# Altium footprint library Generic Footprint.PcbLib: 160 footprints (part 14 of 20) (continued)
## Symbol_FCC-Logo-1.5x1mm_silkscreen [mm] (continued)
1(1.122,0.241) 1(1.122,0.838) 1(1.122,0.841) 1(1.122,1.042) 1(1.122,1.044) 1(1.122,1.045) 1(1.124,0.032) 1(1.124,0.037) 1(1.124,0.17) 1(1.124,0.372) 1(1.124,0.374) 1(1.124,0.702) 1(1.124,0.705) 1(1.124,0.836) 1(1.124,1.04) 1(1.125,0.037) 1(1.125,0.166) 1(1.125,0.168) 1(1.125,0.377) 1(1.127,0.037) 1(1.127,0.238) 1(1.127,0.24) 1(1.127,0.241) 1(1.127,0.374) 1(1.127,0.377) 1(1.127,0.7) 1(1.127,0.835) 1(1.127,0.838) 1(1.127,0.84) 1(1.127,0.909) 1(1.129,0.241) 1(1.129,0.243) 1(1.129,0.376) 1(1.129,0.379) 1(1.129,0.699) 1(1.129,0.702) 1(1.129,0.906) 1(1.129,0.909) 1(1.13,0.376) 1(1.13,0.377) 1(1.13,0.381) 1(1.13,0.702) 1(1.132,0.037) 1(1.132,0.168) 1(1.132,0.172) 1(1.132,0.24) 1(1.132,0.241) 1(1.132,0.379) 1(1.132,0.382) 1(1.132,0.7) 1(1.132,0.909) 1(1.132,1.044) 1(1.134,0.034) 1(1.134,0.036) 1(1.134,0.17) 1(1.134,0.243) 1(1.134,0.245) 1(1.134,0.379) 1(1.134,0.381) 1(1.134,0.697) 1(1.134,0.699) 1(1.134,0.7) 1(1.134,0.836) 1(1.134,0.908) 1(1.134,0.909) 1(1.134,1.039) 1(1.134,1.04) 1(1.134,1.042) 1(1.135,0.833) 1(1.135,0.835) 1(1.135,0.836) 1(1.135,0.838) 1(1.135,0.904) 1(1.137,0.381) 1(1.137,0.382) 1(1.137,0.384) 1(1.139,0.241) 1(1.139,0.245) 1(1.139,0.382) 1(1.139,0.695) 1(1.139,0.697) 1(1.139,0.699) 1(1.141,0.17) 1(1.141,0.172) 1(1.141,0.175) 1(1.141,0.386) 1(1.141,0.388) 1(1.141,0.831) 1(1.141,0.833) 1(1.141,0.908) 1(1.141,1.042) 1(1.142,0.036) 1(1.142,0.694) 1(1.142,0.695) 1(1.142,0.697) 1(1.142,0.835) 1(1.142,0.903) 1(1.142,0.904) 1(1.142,0.906) 1(1.142,1.039) 1(1.144,0.243) 1(1.144,0.389) 1(1.144,0.69) 1(1.144,0.692) 1(1.144,0.694) 1(1.144,0.695) 1(1.144,1.037) 1(1.146,0.692) 1(1.146,0.83) 1(1.146,0.831) 1(1.146,1.04) 1(1.147,0.172) 1(1.147,0.173) 1(1.147,0.175) 1(1.147,0.177) 1(1.147,0.391) 1(1.147,0.688) 1(1.147,0.692) 1(1.147,0.694) 1(1.149,0.391) 1(1.149,0.393) 1(1.149,0.687) 1(1.149,0.83) 1(1.149,0.833) 1(1.149,0.901) 1(1.149,0.903) 1(1.149,0.904) 1(1.149,0.906) 1(1.151,0.245) 1(1.153,0.037) 1(1.153,0.391) 1(1.153,1.035) 1(1.153,1.037) 1(1.154,0.175) 1(1.154,0.177) 1(1.154,0.178) 1(1.154,0.246) 1(1.154,0.393) 1(1.154,0.396) 1(1.154,0.685) 1(1.154,0.831) 1(1.154,1.035) 1(1.156,0.251) 1(1.156,0.393) 1(1.156,0.394) 1(1.156,0.396) 1(1.156,0.398) 1(1.156,0.682) 1(1.156,0.683) 1(1.156,0.899) 1(1.156,0.901) 1(1.156,0.903) 1(1.158,0.177) 1(1.158,0.248) 1(1.158,0.396) 1(1.158,0.398) 1(1.158,0.399) 1(1.158,0.683) 1(1.158,1.035) 1(1.158,1.039) 1(1.159,0.039) 1(1.159,0.042) 1(1.159,0.18) 1(1.159,0.25) 1(1.159,0.251) 1(1.159,0.253) 1(1.159,0.401) 1(1.159,0.68) 1(1.159,0.682) 1(1.159,1.035) 1(1.161,0.398) 1(1.161,0.683) 1(1.161,0.824) 1(1.161,0.828) 1(1.161,0.83) 1(1.161,0.898) 1(1.161,0.899) 1(1.161,0.901) 1(1.163,0.403) 1(1.163,0.678) 1(1.163,0.68) 1(1.163,0.682) 1(1.164,0.182) 1(1.164,0.251) 1(1.164,0.255) 1(1.164,0.405) 1(1.164,0.677) 1(1.164,0.678) 1(1.164,0.68) 1(1.164,0.823) 1(1.164,0.824) 1(1.164,0.826) 1(1.166,0.042) 1(1.166,0.253) 1(1.166,0.405) 1(1.166,0.406) 1(1.166,0.673) 1(1.166,0.675) 1(1.166,0.677) 1(1.166,0.678) 1(1.166,0.894) 1(1.166,0.896) 1(1.166,0.899) 1(1.168,0.041) 1(1.168,0.044) 1(1.168,0.046) 1(1.168,0.406) 1(1.168,0.408) 1(1.168,0.677) 1(1.168,0.821) 1(1.168,0.823) 1(1.168,1.037) 1(1.17,0.184) 1(1.17,0.253) 1(1.17,0.255) 1(1.17,0.257) 1(1.17,0.405) 1(1.17,0.41) 1(1.17,0.671) 1(1.17,0.819) 1(1.17,0.824) 1(1.171,0.182) 1(1.171,0.257) 1(1.171,0.406) 1(1.171,0.408) 1(1.171,0.41) 1(1.171,0.411) 1(1.171,0.67) 1(1.173,0.042) 1(1.173,0.182) 1(1.173,0.408) 1(1.173,0.411) 1(1.173,0.413) 1(1.173,0.668) 1(1.173,0.67) 1(1.173,0.671) 1(1.173,0.823) 1(1.173,0.892) 1(1.173,1.035) 1(1.175,0.044) 1(1.175,0.046) 1(1.175,0.047) 1(1.175,0.185) 1(1.175,0.255) 1(1.175,0.26) 1(1.175,0.41) 1(1.175,0.411) 1(1.175,0.413) 1(1.175,0.415) 1(1.175,0.666) 1(1.175,0.668) 1(1.175,0.671) 1(1.175,0.818) 1(1.175,0.819) 1(1.175,0.821) 1(1.175,1.03) 1(1.176,0.044) 1(1.176,0.046) 1(1.176,0.184) 1(1.176,0.257) 1(1.176,0.26) 1(1.176,0.416) 1(1.176,0.663) 1(1.176,0.665) 1(1.176,0.668) 1(1.176,0.67) 1(1.176,0.819) 1(1.176,0.891) 1(1.176,0.894) 1(1.176,1.034) 1(1.178,0.046) 1(1.178,0.413) 1(1.178,0.415) 1(1.178,0.416) 1(1.178,0.418) 1(1.178,0.42) 1(1.178,0.665) 1(1.178,0.666) 1(1.178,0.816) 1(1.178,0.818) 1(1.178,0.821) 1(1.178,0.894) 1(1.18,0.044) 1(1.18,0.258) 1(1.18,0.415) 1(1.18,0.416) 1(1.18,0.418) 1(1.18,0.422) 1(1.18,0.661) 1(1.18,0.663) 1(1.18,0.666) 1(1.181,0.044) 1(1.181,0.047) 1(1.181,0.184) 1(1.181,0.185) 1(1.181,0.187) 1(1.181,0.418) 1(1.181,0.42) 1(1.181,0.422) 1(1.181,0.423) 1(1.181,0.656) 1(1.181,0.658) 1(1.181,0.659) 1(1.181,0.663) 1(1.181,0.665) 1(1.181,0.814) 1(1.181,0.889) 1(1.181,0.892) 1(1.181,1.028) 1(1.181,1.03) 1(1.181,1.032) 1(1.183,0.046) 1(1.183,0.049) 1(1.183,0.26) 1(1.183,0.263) 1(1.183,0.42) 1(1.183,0.422) 1(1.183,0.423) 1(1.183,0.425) 1(1.183,0.654) 1(1.183,0.816) 1(1.185,0.185) 1(1.185,0.187) 1(1.185,0.189) 1(1.185,0.814) 1(1.185,0.818) 1(1.185,0.891) 1(1.185,0.892) 1(1.187,0.049) 1(1.187,0.051) 1(1.187,0.262) 1(1.187,0.263) 1(1.187,0.265) 1(1.187,0.653) 1(1.187,0.654) 1(1.187,1.027) 1(1.187,1.028) 1(1.187,1.03) 1(1.188,0.047) 1(1.188,0.187) 1(1.188,0.19) 1(1.188,0.267) 1(1.188,0.816) 1(1.188,0.887) 1(1.19,0.189) 1(1.19,0.19) 1(1.19,0.192) 1(1.19,0.263) 1(1.19,0.267) 1(1.19,0.646) 1(1.19,0.648) 1(1.19,0.654) 1(1.19,0.886) 1(1.19,0.889) 1(1.19,0.891) 1(1.192,0.19) 1(1.192,0.265) 1(1.192,0.269) 1(1.192,0.648) 1(1.192,0.651) 1(1.192,0.814) 1(1.192,0.887) 1(1.193,0.189) 1(1.193,0.194) 1(1.193,0.809) 1(1.193,0.884) 1(1.193,0.886) 1(1.193,0.889) 1(1.195,0.049) 1(1.195,0.051) 1(1.195,0.265) 1(1.195,0.267) 1(1.195,0.269) 1(1.195,0.27) 1(1.195,0.649) 1(1.195,0.807) 1(1.195,0.809) 1(1.195,0.811) 1(1.195,0.813) 1(1.195,0.887) 1(1.195,1.025) 1(1.195,1.027) 1(1.195,1.028) 1(1.197,0.049) 1(1.197,1.023) 1(1.198,0.049) 1(1.198,0.195) 1(1.198,0.27) 1(1.198,0.272) 1(1.198,0.806) 1(1.198,0.807) 1(1.198,0.809) 1(1.198,0.882) 1(1.198,0.884) 1(1.198,0.886) 1(1.2,0.269) 1(1.2,1.023) 1(1.2,1.025) 1(1.2,1.027) 1(1.202,0.194) 1(1.202,0.197) 1(1.202,0.272) 1(1.202,0.274) 1(1.202,0.804) 1(1.202,0.806) 1(1.202,0.807) 1(1.202,0.881) 1(1.202,0.884) 1(1.202,1.022) 1(1.204,0.194) 1(1.204,0.27) 1(1.204,0.274) 1(1.204,0.804) 1(1.204,0.806) 1(1.205,0.051) 1(1.205,0.195) 1(1.205,0.199) 1(1.205,0.801) 1(1.205,1.022) 1(1.205,1.025) 1(1.207,0.053) 1(1.207,0.272) 1(1.207,0.801) 1(1.207,0.804) 1(1.207,0.879) 1(1.209,0.195) 1(1.209,0.197) 1(1.209,0.199) 1(1.209,0.201) 1(1.209,0.274) 1(1.209,0.279) 1(1.209,0.799) 1(1.209,0.877) 1(1.209,1.02) 1(1.21,0.275) 1(1.21,0.802) 1(1.21,1.02) 1(1.21,1.023) 1(1.212,0.054) 1(1.212,0.058) 1(1.212,0.197) 1(1.212,0.201) 1(1.212,0.279) 1(1.212,0.799) 1(1.212,0.875) 1(1.214,0.199) 1(1.214,0.202) 1(1.214,0.277) 1(1.214,0.28) 1(1.214,0.797) 1(1.214,0.801) 1(1.215,0.059) 1(1.215,0.282) 1(1.215,0.796) 1(1.215,0.797) 1(1.215,0.874) 1(1.215,0.877) 1(1.217,0.056) 1(1.217,0.058) 1(1.217,0.201) 1(1.217,0.202) 1(1.217,0.204) 1(1.217,0.279) 1(1.217,0.28) 1(1.217,0.284) 1(1.217,0.796) 1(1.217,0.797) 1(1.217,0.799) 1(1.217,0.875) 1(1.217,0.877) 1(1.217,1.022) 1(1.219,0.28) 1(1.219,0.282) 1(1.219,0.286) 1(1.219,0.792) 1(1.219,0.872) 1(1.22,0.202) 1(1.22,0.204) 1(1.22,0.206) 1(1.22,0.282) 1(1.22,0.284) 1(1.22,0.286) 1(1.22,0.287) 1(1.22,0.874) 1(1.22,0.875) 1(1.22,1.015) 1(1.22,1.017) 1(1.22,1.02) 1(1.222,0.058) 1(1.222,0.059) 1(1.222,0.061) 1(1.222,0.79) 1(1.222,0.792) 1(1.222,0.794) 1(1.222,0.796) 1(1.224,0.063) 1(1.224,0.204) 1(1.224,0.206) 1(1.224,0.207) 1(1.224,0.209) 1(1.224,0.284) 1(1.224,0.287) 1(1.224,0.789) 1(1.224,0.79) 1(1.224,0.869) 1(1.224,0.872) 1(1.224,0.874) 1(1.226,0.059) 1(1.226,0.061) 1(1.226,0.206) 1(1.226,0.286) 1(1.226,0.289) 1(1.226,0.789) 1(1.226,0.792) 1(1.226,1.015) 1(1.226,1.017) 1(1.226,1.018) 1(1.227,0.063) 1(1.227,0.065) 1(1.227,0.289) 1(1.227,0.787) 1(1.227,0.79) 1(1.227,0.867) 1(1.227,0.869) 1(1.227,0.872) 1(1.227,1.013) 1(1.229,0.211) 1(1.229,0.287) 1(1.229,0.291) 1(1.229,0.787) 1(1.229,0.87) 1(1.229,1.017) 1(1.231,0.061) 1(1.231,0.065) 1(1.231,0.212) 1(1.231,0.289) 1(1.231,0.291) 1(1.231,0.292) 1(1.231,0.294) 1(1.231,0.789) 1(1.231,1.013) 1(1.232,0.066) 1(1.232,0.291) 1(1.232,0.292) 1(1.232,0.294) 1(1.232,0.296) 1(1.232,0.787) 1(1.232,0.865) 1(1.232,0.869) 1(1.232,1.011) 1(1.232,1.015) 1(1.234,0.063) 1(1.234,0.211) 1(1.234,0.292) 1(1.234,0.785) 1(1.234,0.863) 1(1.236,0.066) 1(1.236,0.212) 1(1.236,0.214) 1(1.236,0.294) 1(1.236,0.296) 1(1.236,0.297) 1(1.236,0.862) 1(1.236,1.01) 1(1.236,1.011) 1(1.236,1.013) 1(1.238,0.068) 1(1.238,0.211) 1(1.238,0.212) 1(1.238,0.216) 1(1.238,0.779) 1(1.238,0.78) 1(1.238,0.784) 1(1.239,0.214) 1(1.239,0.216) 1(1.239,0.218) 1(1.239,0.296) 1(1.239,0.297) 1(1.239,0.299) 1(1.239,0.777) 1(1.239,0.779) 1(1.239,0.78) 1(1.239,0.782) 1(1.241,0.065) 1(1.241,0.068) 1(1.241,0.297) 1(1.241,0.299) 1(1.241,0.777) 1(1.241,0.78) 1(1.241,0.858) 1(1.241,0.86) 1(1.241,0.862) 1(1.241,1.008) 1(1.241,1.01) 1(1.243,0.214) 1(1.243,0.216) 1(1.243,0.218) 1(1.243,0.219) 1(1.243,0.299) 1(1.243,0.773) 1(1.243,0.779) 1(1.243,0.86) 1(1.243,0.862) 1(1.243,1.011) 1(1.244,0.066) 1(1.244,0.301) 1(1.244,0.777) 1(1.244,1.008) 1(1.246,0.772) 1(1.246,0.857) 1(1.246,0.86) 1(1.248,0.068) 1(1.248,0.218) 1(1.248,0.219) 1(1.248,0.221) 1(1.248,0.223) 1(1.248,0.303) 1(1.248,0.772) 1(1.248,0.773) 1(1.248,0.775) 1(1.248,0.855) 1(1.248,0.857) 1(1.248,0.858) 1(1.248,1.01) 1(1.249,0.07) 1(1.249,0.073) 1(1.249,0.219) 1(1.249,0.221) 1(1.249,0.304) 1(1.249,0.773) 1(1.249,0.858) 1(1.249,1.008) 1(1.251,0.221) 1(1.251,0.224) 1(1.251,0.306) 1(1.251,0.772) 1(1.251,0.853) 1(1.251,0.857) 1(1.253,0.226) 1(1.253,0.311) 1(1.253,0.765) 1(1.253,0.767) 1(1.253,0.852) 1(1.254,0.071) 1(1.254,0.073) 1(1.254,0.075) 1(1.254,0.228) 1(1.254,0.308) 1(1.254,0.309) 1(1.254,0.311) 1(1.254,0.313) 1(1.254,0.763) 1(1.254,0.767) 1(1.254,0.768) 1(1.254,0.77) 1(1.254,0.85) 1(1.254,1.003) 1(1.254,1.006) 1(1.256,0.311) 1(1.256,0.313) 1(1.256,0.314) 1(1.256,0.762) 1(1.256,0.765) 1(1.256,0.767) 1(1.256,1.003) 1(1.258,0.073) 1(1.258,0.075) 1(1.258,0.076) 1(1.258,0.226) 1(1.258,0.229) 1(1.258,0.313) 1(1.258,0.314) 1(1.258,0.316) 1(1.258,0.76) 1(1.258,0.762) 1(1.258,0.763) 1(1.258,0.765) 1(1.258,0.848) 1(1.258,1.001) 1(1.258,1.005) 1(1.26,0.226) 1(1.26,0.228) 1(1.26,0.231) 1(1.26,0.314) 1(1.26,0.316) 1(1.26,0.423) 1(1.26,0.425) 1(1.26,0.427) 1(1.26,0.758) 1(1.26,0.76) 1(1.26,0.763) 1(1.26,0.847) 1(1.261,0.075) 1(1.261,0.076) 1(1.261,0.078) 1(1.261,0.228) 1(1.261,0.229) 1(1.261,0.756) 1(1.261,0.758) 1(1.261,0.762) 1(1.261,1) 1(1.261,1.001) 1(1.261,1.003) 1(1.263,0.08) 1(1.263,0.231) 1(1.263,0.233) 1(1.263,0.316) 1(1.263,0.318) 1(1.263,0.756) 1(1.263,0.76) 1(1.263,0.845) 1(1.263,0.998) 1(1.265,0.076) 1(1.265,0.08) 1(1.265,0.229) 1(1.265,0.231) 1(1.265,0.235) 1(1.265,0.32) 1(1.265,0.323) 1(1.265,0.758) 1(1.265,0.843) 1(1.265,1.001) 1(1.266,0.078) 1(1.266,0.082) 1(1.266,0.233) 1(1.266,0.236) 1(1.266,0.321) 1(1.266,0.323) 1(1.266,0.325) 1(1.266,0.751) 1(1.266,0.756) 1(1.266,0.841) 1(1.266,0.843) 1(1.266,0.845) 1(1.266,0.996) 1(1.266,0.998) 1(1.266,1) 1(1.268,0.078) 1(1.268,0.233) 1(1.268,0.235) 1(1.268,0.323) 1(1.268,0.325) 1(1.268,0.326) 1(1.268,0.328) 1(1.268,0.75) 1(1.268,0.755) 1(1.268,0.845) 1(1.268,1) 1(1.27,0.082) 1(1.27,0.083) 1(1.27,0.238) 1(1.27,0.326) 1(1.27,0.748) 1(1.27,0.751) 1(1.27,0.753) 1(1.27,0.84) 1(1.27,0.841) 1(1.27,0.843) 1(1.27,0.994) 1(1.27,0.996) 1(1.27,0.998) 1(1.272,0.08) 1(1.272,0.083) 1(1.272,0.235) 1(1.272,0.236) 1(1.272,0.325) 1(1.272,0.326) 1(1.272,0.328) 1(1.272,0.33) 1(1.272,0.331) 1(1.272,0.746) 1(1.272,0.75) 1(1.272,0.751) 1(1.272,0.838) 1(1.273,0.236) 1(1.273,0.24) 1(1.273,0.328) 1(1.273,0.33) 1(1.273,0.744) 1(1.273,0.748) 1(1.273,0.75) 1(1.273,0.836) 1(1.273,0.84) 1(1.273,0.841) 1(1.273,0.993) 1(1.273,0.994) 1(1.275,0.241) 1(1.275,0.243) 1(1.275,0.33) 1(1.275,0.331) 1(1.275,0.333) 1(1.275,0.335) 1(1.275,0.744) 1(1.275,0.746) 1(1.275,0.748) 1(1.275,0.835) 1(1.275,0.84) 1(1.275,0.996) 1(1.277,0.082) 1(1.277,0.241) 1(1.277,0.331) 1(1.277,0.333) 1(1.277,0.335) 1(1.277,0.746) 1(1.277,0.993) 1(1.278,0.245) 1(1.278,0.744) 1(1.278,0.833) 1(1.28,0.083) 1(1.28,0.087) 1(1.28,0.088) 1(1.28,0.241) 1(1.28,0.333) 1(1.28,0.335) 1(1.28,0.336) 1(1.28,0.34) 1(1.28,0.743) 1(1.28,0.831) 1(1.28,0.994) 1(1.282,0.246) 1(1.282,0.338) 1(1.282,0.34) 1(1.282,0.342) 1(1.282,0.343) 1(1.282,0.736) 1(1.282,0.739) 1(1.282,0.741) 1(1.282,0.83) 1(1.282,0.833) 1(1.283,0.085) 1(1.283,0.087) 1(1.283,0.088) 1(1.283,0.09) 1(1.283,0.246) 1(1.283,0.248) 1(1.283,0.34) 1(1.283,0.342) 1(1.283,0.345) 1(1.283,0.347) 1(1.283,0.731) 1(1.283,0.733) 1(1.283,0.736) 1(1.283,0.738) 1(1.283,0.831) 1(1.283,0.833) 1(1.283,0.993) 1(1.285,0.087) 1(1.285,0.246) 1(1.285,0.248) 1(1.285,0.25) 1(1.285,0.251) 1(1.285,0.342) 1(1.285,0.343) 1(1.285,0.345) 1(1.285,0.348) 1(1.285,0.733) 1(1.285,0.736) 1(1.285,0.828) 1(1.285,0.988) 1(1.285,0.991) 1(1.287,0.09) 1(1.287,0.248) 1(1.287,0.253) 1(1.287,0.343) 1(1.287,0.729) 1(1.287,0.734) 1(1.287,0.828) 1(1.287,0.831) 1(1.287,0.988) 1(1.289,0.088) 1(1.289,0.092) 1(1.289,0.345) 1(1.289,0.348) 1(1.289,0.35) 1(1.289,0.729) 1(1.289,0.733) 1(1.289,0.824) 1(1.289,0.826) 1(1.289,0.986) 1(1.289,0.989) 1(1.29,0.348) 1(1.29,0.35) 1(1.29,0.352) 1(1.29,0.354) 1(1.29,0.724) 1(1.29,0.729) 1(1.29,0.826) 1(1.29,0.828) 1(1.29,0.984) 1(1.29,0.986) 1(1.292,0.09) 1(1.292,0.092) 1(1.292,0.093) 1(1.292,0.255) 1(1.292,0.35) 1(1.292,0.352) 1(1.292,0.354) 1(1.292,0.724) 1(1.292,0.728) 1(1.292,0.823) 1(1.292,0.824) 1(1.292,0.826) 1(1.292,0.983) 1(1.292,0.984) 1(1.292,0.986) 1(1.292,0.988) 1(1.294,0.257) 1(1.294,0.352) 1(1.294,0.354) 1(1.294,0.355) 1(1.294,0.359) 1(1.294,0.719) 1(1.294,0.722) 1(1.294,0.724) 1(1.294,0.726) 1(1.294,0.819) 1(1.294,0.821) 1(1.294,0.823) 1(1.294,0.824) 1(1.294,0.981) 1(1.295,0.092) 1(1.295,0.093) 1(1.295,0.095) 1(1.295,0.258) 1(1.295,0.717) 1(1.295,0.818) 1(1.295,0.821) 1(1.295,0.823) 1(1.297,0.093) 1(1.297,0.095) 1(1.297,0.257) 1(1.297,0.258) 1(1.297,0.26) 1(1.297,0.357) 1(1.297,0.359) 1(1.297,0.362) 1(1.297,0.364) 1(1.297,0.716) 1(1.297,0.717) 1(1.297,0.719) 1(1.297,0.721) 1(1.297,0.816) 1(1.297,0.819) 1(1.297,0.821) 1(1.297,0.979) 1(1.297,0.983) 1(1.297,0.984) 1(1.299,0.257) 1(1.299,0.258) 1(1.299,0.26) 1(1.299,0.262) 1(1.299,0.359) 1(1.299,0.362) 1(1.299,0.365) 1(1.299,0.367) 1(1.299,0.711) 1(1.299,0.712) 1(1.299,0.714) 1(1.299,0.716) 1(1.299,0.719) 1(1.299,0.814) 1(1.299,0.818) 1(1.299,0.819) 1(1.299,0.981) 1(1.3,0.26) 1(1.3,0.262) 1(1.3,0.263) 1(1.3,0.36) 1(1.3,0.362) 1(1.3,0.364) 1(1.3,0.365) 1(1.3,0.367) 1(1.3,0.369) 1(1.3,0.709) 1(1.3,0.711) 1(1.3,0.712) 1(1.3,0.716) 1(1.3,0.717) 1(1.3,0.816) 1(1.3,0.818) 1(1.3,0.979) 1(1.3,0.983) 1(1.302,0.095) 1(1.302,0.262) 1(1.302,0.265) 1(1.302,0.364) 1(1.302,0.365) 1(1.302,0.367) 1(1.302,0.369) 1(1.302,0.371) 1(1.302,0.372) 1(1.302,0.705) 1(1.302,0.707) 1(1.302,0.711) 1(1.302,0.712) 1(1.302,0.813) 1(1.302,0.814) 1(1.302,0.816) 1(1.302,0.977) 1(1.302,0.981) 1(1.304,0.097) 1(1.304,0.267) 1(1.304,0.369) 1(1.304,0.809) 1(1.304,0.811) 1(1.304,0.813) 1(1.304,0.814) 1(1.304,0.977) 1(1.305,0.1) 1(1.305,0.269) 1(1.305,0.371) 1(1.305,0.372) 1(1.305,0.374) 1(1.305,0.376) 1(1.305,0.702) 1(1.305,0.704) 1(1.305,0.705) 1(1.305,0.807) 1(1.305,0.811) 1(1.305,0.813) 1(1.305,0.979) 1(1.307,0.099) 1(1.307,0.1) 1(1.307,0.102) 1(1.307,0.269) 1(1.307,0.27) 1(1.307,0.371) 1(1.307,0.372) 1(1.307,0.374) 1(1.307,0.376) 1(1.307,0.377) 1(1.307,0.699) 1(1.307,0.7) 1(1.307,0.702) 1(1.307,0.705) 1(1.307,0.809) 1(1.307,0.811) 1(1.309,0.1) 1(1.309,0.102) 1(1.309,0.104) 1(1.309,0.269) 1(1.309,0.27) 1(1.309,0.272) 1(1.309,0.374) 1(1.309,0.376) 1(1.309,0.699) 1(1.309,0.7) 1(1.309,0.806) 1(1.309,0.807) 1(1.309,0.809) 1(1.309,0.977) 1(1.311,0.105) 1(1.311,0.27) 1(1.311,0.272) 1(1.311,0.274) 1(1.311,0.388) 1(1.311,0.389) 1(1.311,0.699) 1(1.311,0.7) 1(1.311,0.702) 1(1.311,0.802) 1(1.311,0.804) 1(1.311,0.806) 1(1.311,0.807) 1(1.311,0.976) 1(1.312,0.274) 1(1.312,0.275) 1(1.312,0.379) 1(1.312,0.382) 1(1.312,0.688) 1(1.312,0.69) 1(1.312,0.695) 1(1.312,0.801) 1(1.312,0.804) 1(1.312,0.806) 1(1.312,0.971) 1(1.314,0.102) 1(1.314,0.104) 1(1.314,0.105) 1(1.314,0.107) 1(1.314,0.272) 1(1.314,0.275) 1(1.314,0.277) 1(1.314,0.381) 1(1.314,0.391) 1(1.314,0.687) 1(1.314,0.692) 1(1.314,0.697) 1(1.314,0.799) 1(1.314,0.802) 1(1.314,0.804) 1(1.314,0.974) 1(1.316,0.104) 1(1.316,0.107) 1(1.316,0.109) 1(1.316,0.274) 1(1.316,0.275) 1(1.316,0.277) 1(1.316,0.279) 1(1.316,0.384) 1(1.316,0.386) 1(1.316,0.393) 1(1.316,0.394) 1(1.316,0.682) 1(1.316,0.683) 1(1.316,0.685) 1(1.316,0.688) 1(1.316,0.694) 1(1.316,0.797) 1(1.316,0.801) 1(1.316,0.802) 1(1.316,0.969) 1(1.316,0.971) 1(1.316,0.972) 1(1.317,0.105) 1(1.317,0.277) 1(1.317,0.279) 1(1.317,0.28) 1(1.317,0.393) 1(1.317,0.394) 1(1.317,0.396) 1(1.317,0.398) 1(1.317,0.68) 1(1.317,0.683) 1(1.317,0.685) 1(1.317,0.688) 1(1.317,0.799) 1(1.317,0.801) 1(1.319,0.109) 1(1.319,0.11) 1(1.319,0.279) 1(1.319,0.282) 1(1.319,0.393) 1(1.319,0.394) 1(1.319,0.398) 1(1.319,0.401) 1(1.319,0.677) 1(1.319,0.68) 1(1.319,0.683) 1(1.319,0.685) 1(1.319,0.796) 1(1.319,0.797) 1(1.319,0.799) 1(1.319,0.967) 1(1.319,0.969) 1(1.319,0.971) 1(1.321,0.107) 1(1.321,0.284) 1(1.321,0.399) 1(1.321,0.401) 1(1.321,0.677) 1(1.321,0.678) 1(1.321,0.792) 1(1.321,0.794) 1(1.321,0.797) 1(1.321,0.966) 1(1.321,0.967) 1(1.321,0.969) 1(1.323,0.11) 1(1.323,0.286) 1(1.323,0.398) 1(1.323,0.68) 1(1.323,0.79) 1(1.323,0.794) 1(1.323,0.964) 1(1.324,0.109) 1(1.324,0.286) 1(1.324,0.287) 1(1.324,0.401) 1(1.324,0.403) 1(1.324,0.413) 1(1.324,0.415) 1(1.324,0.665) 1(1.324,0.673) 1(1.324,0.675) 1(1.324,0.677) 1(1.324,0.789) 1(1.324,0.792) 1(1.324,0.794) 1(1.324,0.966) 1(1.326,0.286) 1(1.326,0.287) 1(1.326,0.289) 1(1.326,0.405) 1(1.326,0.406) 1(1.326,0.408) 1(1.326,0.413) 1(1.326,0.415) 1(1.326,0.418) 1(1.326,0.659) 1(1.326,0.665) 1(1.326,0.671) 1(1.326,0.79) 1(1.326,0.792) 1(1.326,0.964) 1(1.326,0.966) 1(1.326,0.967) 1(1.328,0.11) 1(1.328,0.294) 1(1.328,0.41) 1(1.328,0.411) 1(1.328,0.413) 1(1.328,0.418) 1(1.328,0.42) 1(1.328,0.422) 1(1.328,0.653) 1(1.328,0.654) 1(1.328,0.656) 1(1.328,0.659) 1(1.328,0.665) 1(1.328,0.666) 1(1.328,0.668) 1(1.328,0.67) 1(1.328,0.787) 1(1.328,0.789) 1(1.328,0.79) 1(1.329,0.112) 1(1.329,0.287) 1(1.329,0.291) 1(1.329,0.292) 1(1.329,0.296) 1(1.329,0.415) 1(1.329,0.416) 1(1.329,0.423) 1(1.329,0.658) 1(1.329,0.661) 1(1.329,0.663) 1(1.329,0.785) 1(1.329,0.789) 1(1.331,0.114) 1(1.331,0.117) 1(1.331,0.294) 1(1.331,0.418) 1(1.331,0.422) 1(1.331,0.423) 1(1.331,0.649) 1(1.331,0.651) 1(1.331,0.654) 1(1.331,0.656) 1(1.331,0.659) 1(1.331,0.78) 1(1.331,0.782) 1(1.331,0.784) 1(1.331,0.964) 1(1.333,0.117) 1(1.333,0.119) 1(1.333,0.294) 1(1.333,0.297) 1(1.333,0.422) 1(1.333,0.423) 1(1.333,0.649) 1(1.333,0.651) 1(1.333,0.654) 1(1.333,0.656) 1(1.333,0.782) 1(1.333,0.959) 1(1.333,0.962) 1(1.334,0.116) 1(1.334,0.119) 1(1.334,0.299) 1(1.334,0.427) 1(1.334,0.649) 1(1.334,0.651) 1(1.334,0.779) 1(1.334,0.78) 1(1.334,0.782) 1(1.334,0.957) 1(1.334,0.959) 1(1.336,0.117) 1(1.336,0.121) 1(1.336,0.299) 1(1.336,0.304) 1(1.336,0.646) 1(1.336,0.775) 1(1.336,0.777) 1(1.336,0.78) 1(1.336,0.955) 1(1.336,0.957) 1(1.336,0.96) 1(1.338,0.122) 1(1.338,0.299) 1(1.338,0.306) 1(1.338,0.777) 1(1.338,0.954) 1(1.338,0.955) 1(1.338,0.957) 1(1.338,0.959) 1(1.339,0.119) 1(1.339,0.121) 1(1.339,0.124) 1(1.339,0.301) 1(1.339,0.304) 1(1.339,0.77) 1(1.339,0.772) 1(1.339,0.775) 1(1.339,0.777) 1(1.339,0.952) 1(1.339,0.954) 1(1.339,0.955) 1(1.341,0.121) 1(1.341,0.122) 1(1.341,0.124) 1(1.341,0.126) 1(1.341,0.303) 1(1.341,0.306) 1(1.341,0.308) 1(1.341,0.772) 1(1.341,0.775) 1(1.343,0.122) 1(1.343,0.304) 1(1.343,0.765) 1(1.343,0.767) 1(1.343,0.768) 1(1.343,0.772) 1(1.343,0.773) 1(1.343,0.95) 1(1.343,0.952) 1(1.345,0.126) 1(1.345,0.127) 1(1.345,0.763) 1(1.345,0.954) 1(1.346,0.124) 1(1.346,0.765) 1(1.346,0.948) 1(1.346,0.95) 1(1.346,0.952) 1(1.348,0.126) 1(1.348,0.127) 1(1.35,0.127) 1(1.35,0.948) 1(1.35,0.95) 1(1.351,0.132) 1(1.351,0.943) 1(1.351,0.948) 1(1.353,0.129) 1(1.353,0.132) 1(1.353,0.134) 1(1.353,0.947) 1(1.355,0.131) 1(1.355,0.943) 1(1.357,0.132) 1(1.357,0.134) 1(1.357,0.136) 1(1.357,0.94) 1(1.357,0.942) 1(1.357,0.945) 1(1.358,0.134) 1(1.358,0.136) 1(1.358,0.138) 1(1.358,0.94) 1(1.358,0.942) 1(1.358,0.943) 1(1.36,0.139) 1(1.36,0.942) 1(1.362,0.136) 1(1.362,0.138) 1(1.362,0.139) 1(1.362,0.935) 1(1.362,0.94) 1(1.363,0.138) 1(1.363,0.938) 1(1.365,0.139) 1(1.365,0.933) 1(1.365,0.935) 1(1.367,0.141) 1(1.367,0.937) 1(1.368,0.144) 1(1.368,0.933) 1(1.368,0.935) 1(1.37,0.144) 1(1.37,0.146) 1(1.37,0.933) 1(1.372,0.143) 1(1.372,0.146) 1(1.372,0.148) 1(1.372,0.928) 1(1.374,0.144) 1(1.374,0.148) 1(1.374,0.15) 1(1.374,0.926) 1(1.375,0.146) 1(1.375,0.148) 1(1.375,0.15) 1(1.375,0.151) 1(1.375,0.153) 1(1.375,0.925) 1(1.375,0.928) 1(1.375,0.93) 1(1.375,0.932) 1(1.377,0.15) 1(1.377,0.151) 1(1.377,0.923) 1(1.377,0.926) 1(1.377,0.928) 1(1.379,0.151) 1(1.379,0.153) 1(1.379,0.925) 1(1.379,0.926) 1(1.38,0.923) 1(1.38,0.925) 1(1.382,0.918) 1(1.382,0.923) 1(1.384,0.153) 1(1.384,0.918) 1(1.384,0.921) 1(1.385,0.155) 1(1.385,0.156) 1(1.385,0.16) 1(1.385,0.161) 1(1.385,0.92) 1(1.387,0.16) 1(1.387,0.918) 1(1.389,0.158) 1(1.389,0.161) 1(1.389,0.163) 1(1.391,0.16) 1(1.391,0.163) 1(1.391,0.165) 1(1.391,0.166) 1(1.391,0.911) 1(1.391,0.913) 1(1.392,0.161) 1(1.392,0.165) 1(1.392,0.168) 1(1.392,0.909) 1(1.392,0.913) 1(1.392,0.915) 1(1.392,0.916) 1(1.394,0.163) 1(1.394,0.165) 1(1.394,0.166) 1(1.394,0.908) 1(1.394,0.909) 1(1.394,0.911) 1(1.394,0.913) 1(1.396,0.166) 1(1.396,0.168) 1(1.396,0.17) 1(1.396,0.911) 1(1.397,0.17) 1(1.397,0.908) 1(1.397,0.909) 1(1.399,0.168) 1(1.401,0.17) 1(1.401,0.175) 1(1.401,0.901) 1(1.401,0.903) 1(1.401,0.908) 1(1.402,0.172) 1(1.402,0.173) 1(1.402,0.175) 1(1.402,0.177) 1(1.402,0.178) 1(1.402,0.899) 1(1.402,0.903) 1(1.402,0.904) 1(1.402,0.906) 1(1.404,0.177) 1(1.404,0.18) 1(1.404,0.898) 1(1.404,0.901) 1(1.404,0.903) 1(1.406,0.175) 1(1.406,0.178) 1(1.406,0.899) 1(1.406,0.901) 1(1.408,0.177) 1(1.408,0.18) 1(1.408,0.182) 1(1.408,0.894) 1(1.408,0.896) 1(1.408,0.898) 1(1.408,0.899) 1(1.409,0.178) 1(1.409,0.182) 1(1.409,0.184) 1(1.409,0.185) 1(1.409,0.892) 1(1.409,0.896) 1(1.409,0.898) 1(1.411,0.18) 1(1.411,0.182) 1(1.411,0.184) 1(1.411,0.891) 1(1.411,0.892) 1(1.411,0.894) 1(1.411,0.896) 1(1.413,0.185) 1(1.413,0.891) 1(1.413,0.894) 1(1.414,0.184) 1(1.414,0.892) 1(1.416,0.185) 1(1.416,0.19) 1(1.416,0.886) 1(1.416,0.887) 1(1.418,0.187) 1(1.418,0.19) 1(1.418,0.192) 1(1.418,0.194) 1(1.418,0.882) 1(1.418,0.884) 1(1.418,0.886) 1(1.418,0.887) 1(1.418,0.891) 1(1.419,0.189) 1(1.419,0.192) 1(1.419,0.195) 1(1.419,0.881) 1(1.419,0.882) 1(1.419,0.887) 1(1.419,0.889) 1(1.421,0.19) 1(1.421,0.194) 1(1.421,0.879) 1(1.421,0.886) 1(1.423,0.192) 1(1.423,0.195) 1(1.423,0.197) 1(1.423,0.877) 1(1.423,0.881) 1(1.423,0.882) 1(1.424,0.194) 1(1.424,0.197) 1(1.424,0.199) 1(1.424,0.875) 1(1.424,0.877) 1(1.424,0.879) 1(1.424,0.881) 1(1.426,0.195) 1(1.426,0.199) 1(1.426,0.874) 1(1.426,0.879) 1(1.428,0.197) 1(1.428,0.199) 1(1.428,0.874) 1(1.428,0.875) 1(1.428,0.877) 1(1.43,0.201) 1(1.43,0.202) 1(1.43,0.206) 1(1.43,0.87) 1(1.43,0.875) 1(1.431,0.206) 1(1.431,0.207) 1(1.431,0.869) 1(1.433,0.204) 1(1.433,0.207) 1(1.433,0.209) 1(1.433,0.865) 1(1.433,0.867) 1(1.433,0.87) 1(1.433,0.874) 1(1.435,0.206) 1(1.435,0.207) 1(1.435,0.209) 1(1.435,0.211) 1(1.435,0.212) 1(1.435,0.863) 1(1.435,0.865) 1(1.435,0.87) 1(1.435,0.872) 1(1.436,0.209) 1(1.436,0.211) 1(1.436,0.214) 1(1.436,0.862) 1(1.436,0.863) 1(1.438,0.211) 1(1.438,0.214) 1(1.438,0.86) 1(1.438,0.862) 1(1.438,0.865) 1(1.44,0.214) 1(1.44,0.858) 1(1.44,0.86) 1(1.44,0.863) 1(1.442,0.216) 1(1.442,0.219) 1(1.442,0.858) 1(1.442,0.862) 1(1.443,0.218) 1(1.443,0.219) 1(1.443,0.221) 1(1.443,0.855) 1(1.443,0.858) 1(1.443,0.86) 1(1.445,0.219) 1(1.445,0.221) 1(1.445,0.852) 1(1.445,0.853) 1(1.445,0.855) 1(1.445,0.857) 1(1.447,0.221) 1(1.447,0.223) 1(1.447,0.224) 1(1.447,0.228) 1(1.447,0.852) 1(1.447,0.853) 1(1.447,0.855) 1(1.448,0.848) 1(1.448,0.85) 1(1.448,0.853) 1(1.45,0.226) 1(1.45,0.228) 1(1.45,0.229) 1(1.45,0.231) 1(1.45,0.852) 1(1.452,0.228) 1(1.452,0.229) 1(1.452,0.231) 1(1.452,0.233) 1(1.452,0.235) 1(1.452,0.841) 1(1.452,0.843) 1(1.453,0.229) 1(1.453,0.231) 1(1.453,0.235) 1(1.453,0.236) 1(1.453,0.84) 1(1.453,0.843) 1(1.453,0.847) 1(1.455,0.238) 1(1.455,0.838) 1(1.455,0.84) 1(1.455,0.843) 1(1.455,0.845) 1(1.457,0.235) 1(1.457,0.236) 1(1.457,0.238) 1(1.457,0.838) 1(1.458,0.236) 1(1.458,0.241) 1(1.458,0.243) 1(1.458,0.835) 1(1.458,0.84) 1(1.46,0.238) 1(1.46,0.24) 1(1.46,0.241) 1(1.46,0.243) 1(1.46,0.245) 1(1.46,0.246) 1(1.46,0.83) 1(1.46,0.831) 1(1.46,0.833) 1(1.46,0.835) 1(1.46,0.838) 1(1.462,0.241) 1(1.462,0.245) 1(1.462,0.248) 1(1.462,0.828) 1(1.462,0.83) 1(1.462,0.831) 1(1.462,0.835) 1(1.462,0.836) 1(1.464,0.243) 1(1.464,0.245) 1(1.464,0.246) 1(1.464,0.248) 1(1.464,0.824) 1(1.464,0.826) 1(1.464,0.828) 1(1.465,0.246) 1(1.465,0.25) 1(1.465,0.251) 1(1.465,0.828) 1(1.465,0.83) 1(1.465,0.831) 1(1.467,0.248) 1(1.467,0.253) 1(1.467,0.255) 1(1.467,0.821) 1(1.467,0.823) 1(1.467,0.824) 1(1.467,0.826) 1(1.469,0.253) 1(1.469,0.255) 1(1.469,0.257) 1(1.469,0.818) 1(1.469,0.819) 1(1.469,0.821) 1(1.469,0.824) 1(1.469,0.826) 1(1.47,0.253) 1(1.47,0.255) 1(1.47,0.257) 1(1.47,0.818) 1(1.47,0.819) 1(1.472,0.257) 1(1.472,0.818) 1(1.472,0.819) 1(1.472,0.821) 1(1.474,0.258) 1(1.474,0.265) 1(1.474,0.309) 1(1.474,0.811) 1(1.476,0.26) 1(1.476,0.262) 1(1.476,0.265) 1(1.476,0.306) 1(1.476,0.311) 1(1.476,0.807) 1(1.476,0.809) 1(1.476,0.811) 1(1.476,0.816) 1(1.477,0.263) 1(1.477,0.269) 1(1.477,0.27) 1(1.477,0.272) 1(1.477,0.308) 1(1.477,0.804) 1(1.477,0.806) 1(1.477,0.807) 1(1.477,0.809) 1(1.477,0.811) 1(1.477,0.813) 1(1.477,0.814) 1(1.479,0.265) 1(1.479,0.267) 1(1.479,0.27) 1(1.479,0.274) 1(1.479,0.275) 1(1.479,0.801) 1(1.479,0.802) 1(1.479,0.804) 1(1.479,0.809) 1(1.481,0.275) 1(1.481,0.277) 1(1.481,0.279) 1(1.481,0.797) 1(1.481,0.799) 1(1.481,0.804) 1(1.481,0.807) 1(1.482,0.27) 1(1.482,0.801) 1(1.484,0.275) 1(1.484,0.279) 1(1.484,0.28) 1(1.484,0.796) 1(1.484,0.799) 1(1.484,0.801) 1(1.486,0.279) 1(1.486,0.28) 1(1.486,0.796) 1(1.486,0.799) 1(1.487,0.28) 1(1.487,0.282) 1(1.487,0.792) 1(1.487,0.794) 1(1.487,0.796) 1(1.489,0.284) 1(1.489,0.286) 1(1.489,0.292) 1(1.489,0.782) 1(1.489,0.784) 1(1.489,0.79) 1(1.491,0.287) 1(1.491,0.289) 1(1.491,0.294) 1(1.491,0.789) 1(1.493,0.292) 1(1.493,0.294) 1(1.493,0.296) 1(1.493,0.297) 1(1.493,0.777) 1(1.493,0.779) 1(1.493,0.78) 1(1.493,0.782) 1(1.493,0.785) 1(1.493,0.787) 1(1.494,0.291) 1(1.494,0.292) 1(1.494,0.294) 1(1.494,0.297) 1(1.494,0.299) 1(1.494,0.301) 1(1.494,0.303) 1(1.494,0.773) 1(1.494,0.775) 1(1.494,0.779) 1(1.494,0.782) 1(1.496,0.297) 1(1.496,0.299) 1(1.496,0.301) 1(1.496,0.304) 1(1.496,0.77) 1(1.496,0.772) 1(1.496,0.775) 1(1.496,0.779) 1(1.498,0.299) 1(1.498,0.301) 1(1.498,0.304) 1(1.498,0.768) 1(1.498,0.77) 1(1.498,0.772) 1(1.498,0.775) 1(1.499,0.768) 1(1.501,0.304) 1(1.501,0.306) 1(1.501,0.308) 1(1.501,0.768) 1(1.501,0.77) 1(1.501,0.772) 1(1.503,0.308) 1(1.503,0.309) 1(1.503,0.767) 1(1.504,0.311) 1(1.504,0.763)
Top Overlay:
  drawing of 4310 lines, arcs and shapes, not listed